# Altium integrated library Cap-Cer-SMD_V2.IntLib: 957 symbols (part 2 of 7)
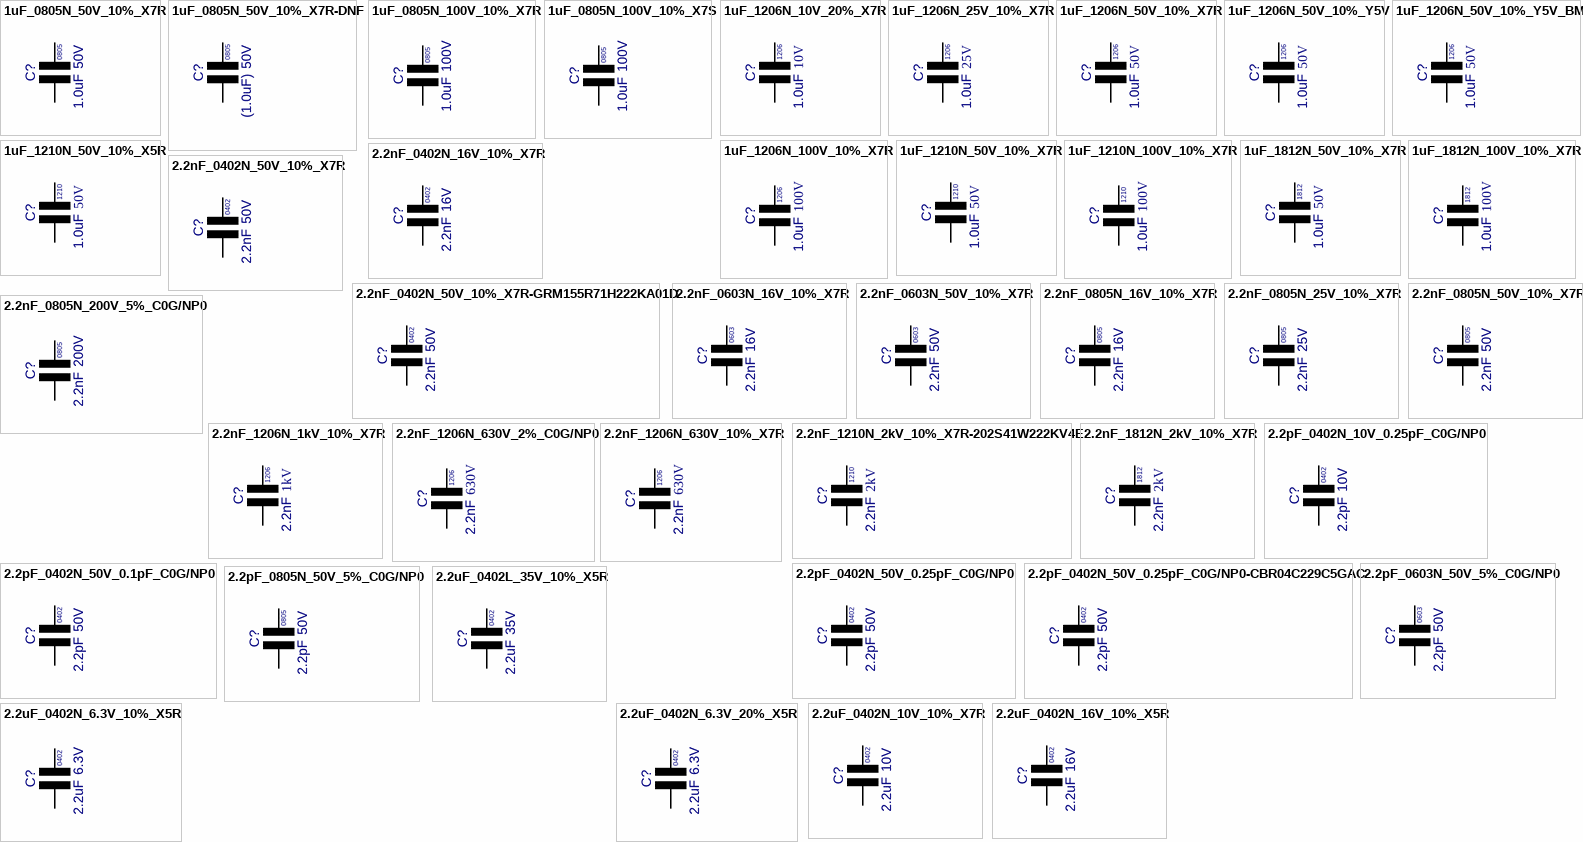
[diagram p24: symbols 1uF_0805N_50V_10%_X7R to 2.2uF_0402N_16V_10%_X5R]

## 2.2nF_1210N_2kV_10%_X7R-202S41W222KV4E
designator C?, comment value 2.2nF  Voltage: 2kV  Text1: 1210  (hidden comment: 2.2nF_C1210_2kV_10%_X7R)
Cap Ceramic X7R; Manufacturer: Johanson; Part Number: 202S41W222KV4E; Tol: 10%; Package: CAPC1210X180N; EDM-PN: *; Text2: *; SAAB PN: *; DCE Part No: *
footprint CAPC1210X180N (Chip Capacitor, 1210, 2-Leads, Body 3.2x2.5mm, IPC Medium Density)
pins: 1, 2

## 2.2nF_1812N_2kV_10%_X7R
designator C?, comment value 2.2nF  Voltage: 2kV  Text1: 1812  (hidden comment: 2.2nF_C1812_2kV_10%_X7R)
Cap Ceramic X7R; Manufacturer: Various; Part Number: 2.2nF 1812 2kV 10% X7R; Tol: 10%; Package: CAPC1812X135N; EDM-PN: *; Text2: *; SAAB PN: *; DCE Part No: *
footprint CAPC1812X135N (Chip Capacitor, 1812, 2-Leads, Body 4.5x3.2mm, IPC Medium Density)
pins: 1, 2

## 2.2pF_0402N_10V_0.25pF_C0G/NP0
designator C?, comment value 2.2pF  Voltage: 10V  Text1: 0402  (hidden comment: 2.2pF_C0402_10V_0.25_C0G/NP0)
Cap Ceramic C0G/NP0; Manufacturer: Various; Part Number: 2.2pF 0402 10V 0.25 C0G/NP0; Tol: 0.25pF; Package: CAPC0402X60N; EDM-PN: *; Text2: *; SAAB PN: *; DCE Part No: *
footprint CAPC0402X60N (Chip Capacitor, 0402, 2-Leads, Body 1.0x0.5mm, IPC Medium Density)
pins: 1, 2

## 2.2pF_0402N_50V_0.1pF_C0G/NP0
designator C?, comment value 2.2pF  Voltage: 50V  Text1: 0402  (hidden comment: 2.2pF_C0402_50V_0.1pF_C0G/NP0)
Cap Ceramic C0G/NP0; Manufacturer: Various; Part Number: 2.2pF 0402 50V 0.1pF C0G/NP0; EDM-PN: CAP1388; Tol: 0.1pF; Package: CAPC0402X60N; Text2: *; SAAB PN: *; DCE Part No: *
footprint CAPC0402X60N (Chip Capacitor, 0402, 2-Leads, Body 1.0x0.5mm, IPC Medium Density)
pins: 1, 2

## 2.2pF_0402N_50V_0.25pF_C0G/NP0
designator C?, comment value 2.2pF  Voltage: 50V  Text1: 0402  (hidden comment: 2.2pF_C0402_50V_0.25pF_C0G/NP0)
Cap Ceramic C0G/NP0; Manufacturer: Various; Part Number: 2.2pF 0402 50V 0.25pF C0G/NP0; EDM-PN: CAP603; Tol: 0.25pF; Package: CAPC0402X60N; Text2: *; SAAB PN: *; DCE Part No: *
footprint CAPC0402X60N (Chip Capacitor, 0402, 2-Leads, Body 1.0x0.5mm, IPC Medium Density)
pins: 1, 2

## 2.2pF_0402N_50V_0.25pF_C0G/NP0-CBR04C229C5GAC
designator C?, comment value 2.2pF  Voltage: 50V  Text1: 0402  (hidden comment: CBR04C229C5GAC)
Cap Ceramic C0G/NP0 HiQ-CBR Series for RF; Manufacturer: Kemet; EDM-PN: CAP1404; Tol: 0.25pF; Part Number: CBR04C229C5GAC; Package: CAPC0402X60N; Text2: *; SAAB PN: *; DCE Part No: *
footprint CAPC0402X60N (Chip Capacitor, 0402, 2-Leads, Body 1.0x0.5mm, IPC Medium Density)
pins: 1, 2

## 2.2pF_0603N_50V_5%_C0G/NP0
designator C?, comment value 2.2pF  Voltage: 50V  Text1: 0603  (hidden comment: 2.2pF_C0603_50V_5%_C0G/NP0)
Cap Ceramic C0G/NP0; Manufacturer: Various; Part Number: 2.2pF 0603 50V 5% C0G/NP0; Tol: 5%; Package: CAPC0603X85N; EDM-PN: *; Text2: *; SAAB PN: *; DCE Part No: *
footprint CAPC0603X85N (Chip Capacitor, 0603, 2-Leads, Body 1.6x0.8mm, IPC Medium Density)
pins: 1, 2

## 2.2pF_0805N_50V_5%_C0G/NP0
designator C?, comment value 2.2pF  Voltage: 50V  Text1: 0805  (hidden comment: 2.2pF_C0805_50V_5%_C0G/NP0)
Cap Ceramic C0G/NP0; Manufacturer: Various; Part Number: 2.2pF 0805 50V 5% C0G/NP0; Tol: 5%; Package: CAPC0805X110N; EDM-PN: *; Text2: *; SAAB PN: *; DCE Part No: *
footprint CAPC0805X110N (Chip Capacitor, 0805, 2-Leads, Body 2.0x1.3mm, IPC Medium Density)
pins: 1, 2

## 2.2uF_0402L_35V_10%_X5R
designator C?, comment value 2.2uF  Voltage: 35V  Text1: 0402  (hidden comment: 2.2uF_C0402_35V_10%_X5R)
Cap Ceramic X5R; Manufacturer: Various; Part Number: 2.2uF 0402 35V 10% X5R; Tol: 10%; Package: CAPC0402X60L; EDM-PN: *; Text2: *; SAAB PN: *; DCE Part No: *
footprint CAPC0402X60L (Chip Capacitor, 0402, 2-Leads, Body 1.0x0.5mm, IPC High Density)
pins: 1, 2

## 2.2uF_0402N_6.3V_10%_X5R
designator C?, comment value 2.2uF  Voltage: 6.3V  Text1: 0402  (hidden comment: 2.2uF_C0402_6.3_10%_X5R)
Cap Ceramic X5R; Manufacturer: Various; Part Number: 2.2uF 0402 6.3V 10% X5R; Tol: 10%; Package: CAPC0402X60N; EDM-PN: *; Text2: *; SAAB PN: *; DCE Part No: *
footprint CAPC0402X60N (Chip Capacitor, 0402, 2-Leads, Body 1.0x0.5mm, IPC Medium Density)
pins: 1, 2

## 2.2uF_0402N_6.3V_20%_X5R
designator C?, comment value 2.2uF  Voltage: 6.3V  Text1: 0402  (hidden comment: 2.2uF_C0402_6.3V_20%_X5R)
Cap Ceramic X5R; Manufacturer: Various; Part Number: 2.2uF 0402 6.3V 20% X5R; DCE Part No: 9725; EDM-PN: CAP323; Tol: 20%; Package: CAPC0402X60N; Text2: *; SAAB PN: *
footprint CAPC0402X60N (Chip Capacitor, 0402, 2-Leads, Body 1.0x0.5mm, IPC Medium Density)
pins: 1, 2

## 2.2uF_0402N_10V_10%_X7R
designator C?, comment value 2.2uF  Voltage: 10V  Text1: 0402  (hidden comment: 2.2uF_C0402_10V_10%_X7R)
Cap Ceramic X7R; Manufacturer: Various; Part Number: 2.2uF 0402 10V 10% X7R; Tol: 10%; Package: CAPC0402X60N; EDM-PN: *; Text2: *; SAAB PN: *; DCE Part No: *
footprint CAPC0402X60N (Chip Capacitor, 0402, 2-Leads, Body 1.0x0.5mm, IPC Medium Density)
pins: 1, 2

## 2.2uF_0402N_16V_10%_X5R
designator C?, comment value 2.2uF  Voltage: 16V  Text1: 0402  (hidden comment: 2.2uF_C0402_16V_10%_X5R)
Cap Ceramic X5R; Manufacturer: Various; Part Number: 2.2uF 0402 16V 10% X5R; EDM-PN: CAP1331; Tol: 10%; Package: CAPC0402X60N; Text2: *; SAAB PN: *; DCE Part No: *
footprint CAPC0402X60N (Chip Capacitor, 0402, 2-Leads, Body 1.0x0.5mm, IPC Medium Density)
pins: 1, 2

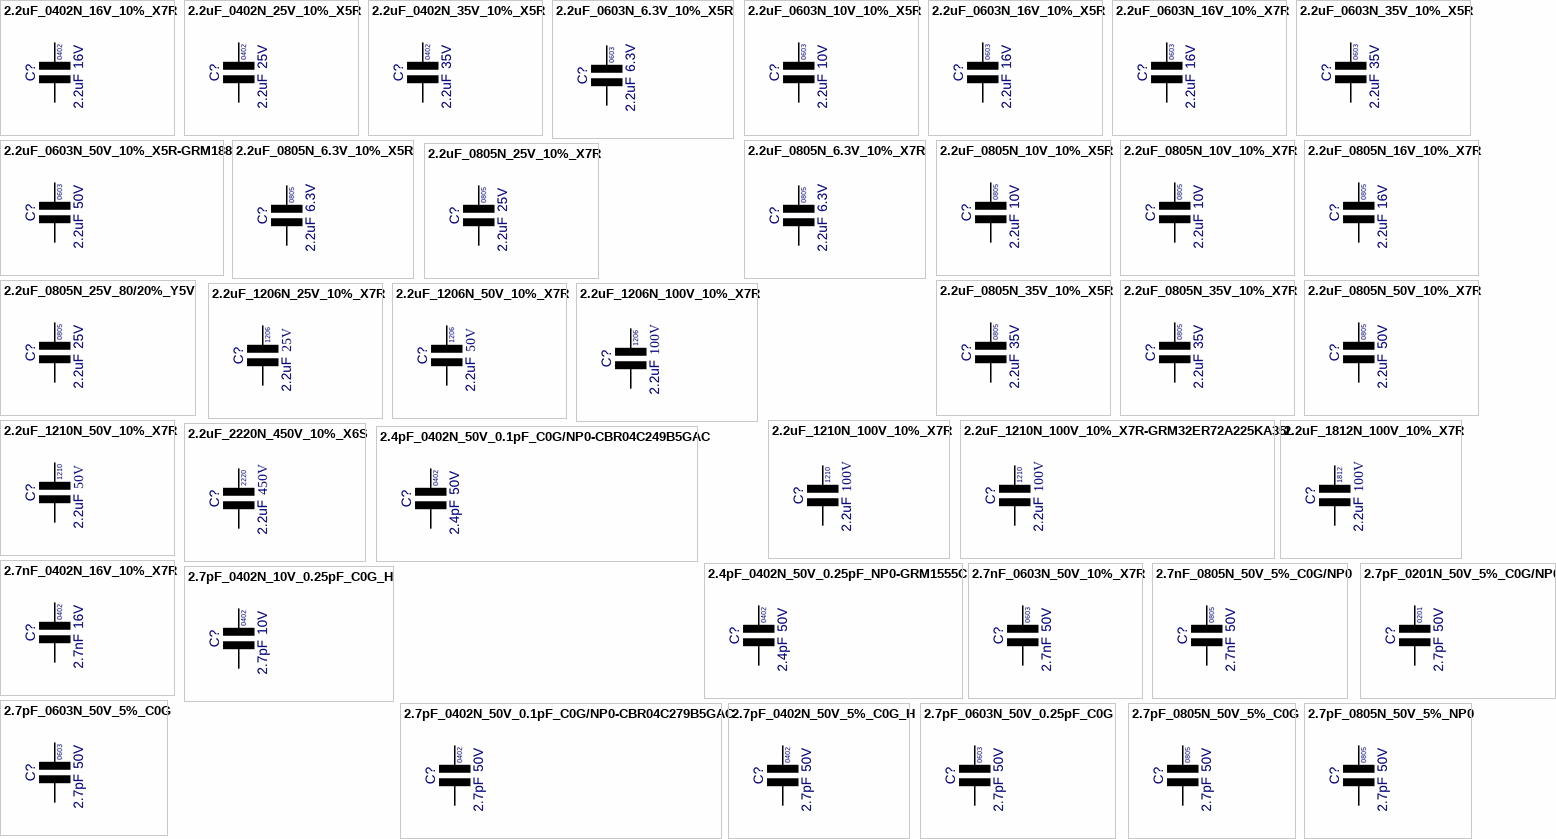
[diagram p4: symbols 2.2uF_0402N_16V_10%_X7R to 2.7pF_0805N_50V_5%_NP0]

## 2.2uF_0402N_16V_10%_X7R
designator C?, comment value 2.2uF  Voltage: 16V  Text1: 0402  (hidden comment: 2.2uF_C0402_16V_10%_X7R)
Cap Ceramic X7R; Manufacturer: Various; Part Number: 2.2uF 0402 16V 10% X7R; EDM-PN: CAP1033; Tol: 10%; Package: CAPC0402X60N; Text2: *; SAAB PN: *; DCE Part No: *
footprint CAPC0402X60N (Chip Capacitor, 0402, 2-Leads, Body 1.0x0.5mm, IPC Medium Density)
pins: 1, 2

## 2.2uF_0402N_25V_10%_X5R
designator C?, comment value 2.2uF  Voltage: 25V  Text1: 0402  (hidden comment: 2.2uF_C0402_25V_10%_X5R)
Cap Ceramic X5R; Manufacturer: Various; Part Number: 2.2uF 0402 25V 10% X5R; Tol: 10%; Package: CAPC0402X60N; EDM-PN: *; Text2: *; SAAB PN: *; DCE Part No: *
footprint CAPC0402X60N (Chip Capacitor, 0402, 2-Leads, Body 1.0x0.5mm, IPC Medium Density)
pins: 1, 2

## 2.2uF_0402N_35V_10%_X5R
designator C?, comment value 2.2uF  Voltage: 35V  Text1: 0402  (hidden comment: 2.2uF_C0402_35V_10%_X5R)
Cap Ceramic X5R; Manufacturer: Various; Part Number: 2.2uF 0402 35V 10% X5R; Tol: 10%; Package: CAPC0402X60N; EDM-PN: *; Text2: *; SAAB PN: *; DCE Part No: *
footprint CAPC0402X60N (Chip Capacitor, 0402, 2-Leads, Body 1.0x0.5mm, IPC Medium Density)
pins: 1, 2

## 2.2uF_0603N_6.3V_10%_X5R
designator C?, comment value 2.2uF  Voltage: 6.3V  Text1: 0603  (hidden comment: 2.2uF_C0603_6.3V_10%_X5R)
Cap Ceramic X5R; Manufacturer: Various; Part Number: 2.2uF 0603 6.3V 10% X5R; Tol: 10%; Package: CAPC0603X85N; EDM-PN: *; Text2: *; SAAB PN: *; DCE Part No: *
footprint CAPC0603X85N (Chip Capacitor, 0603, 2-Leads, Body 1.6x0.8mm, IPC Medium Density)
pins: 1, 2

## 2.2uF_0603N_10V_10%_X5R
designator C?, comment value 2.2uF  Voltage: 10V  Text1: 0603  (hidden comment: 2.2uF_C0603_10V_10%_X5R)
Cap Ceramic X5R; Manufacturer: Various; Part Number: 2.2uF 0603 10V 10% X5R; EDM-PN: CAP600; Tol: 10%; Package: CAPC0603X85N; Text2: *; SAAB PN: *; DCE Part No: *
footprint CAPC0603X85N (Chip Capacitor, 0603, 2-Leads, Body 1.6x0.8mm, IPC Medium Density)
pins: 1, 2

## 2.2uF_0603N_16V_10%_X5R
designator C?, comment value 2.2uF  Voltage: 16V  Text1: 0603  (hidden comment: 2.2uF_C0603_16V_10%_X5R)
Cap Ceramic X5R; Manufacturer: Various; Part Number: 2.2uF 0603 16V 10% X5R; EDM-PN: CAP616; Tol: 10%; Package: CAPC0603X85N; Text2: *; SAAB PN: *; DCE Part No: *
footprint CAPC0603X85N (Chip Capacitor, 0603, 2-Leads, Body 1.6x0.8mm, IPC Medium Density)
pins: 1, 2

## 2.2uF_0603N_16V_10%_X7R
designator C?, comment value 2.2uF  Voltage: 16V  Text1: 0603  (hidden comment: 2.2uF_C0603_16V_10%_X7R)
Cap Ceramic X7R; Manufacturer: Various; Part Number: 2.2uF 0603 16V 10% X7R; EDM-PN: CAP616; Tol: 10%; Reutech PN: 5910-CA-0549; Package: CAPC0603X85N; Text2: *; SAAB PN: *; DCE Part No: *
footprint CAPC0603X85N (Chip Capacitor, 0603, 2-Leads, Body 1.6x0.8mm, IPC Medium Density)
pins: 1, 2

## 2.2uF_0603N_35V_10%_X5R
designator C?, comment value 2.2uF  Voltage: 35V  Text1: 0603  (hidden comment: 2.2uF_C0603_35V_10%_X5R)
Cap Ceramic X5R; Manufacturer: Various; Part Number: 2.2uF 0603 35V 10% X5R; EDM-PN: CAP940; Tol: 10%; Package: CAPC0603X85N; Text2: *; SAAB PN: *; DCE Part No: *
footprint CAPC0603X85N (Chip Capacitor, 0603, 2-Leads, Body 1.6x0.8mm, IPC Medium Density)
pins: 1, 2

## 2.2uF_0603N_50V_10%_X5R-GRM188
designator C?, comment value 2.2uF  Voltage: 50V  Text1: 0603  (hidden comment: 2.2uF_C0603_50V_10%_X5R)
Cap Ceramic X5R; Manufacturer: Murata; Part Number: GRM188R61H225KE11D; Tol: 10%; Package: CAPC0603X85N; EDM-PN: *; Text2: *; SAAB PN: *; DCE Part No: *
footprint CAPC0603X85N (Chip Capacitor, 0603, 2-Leads, Body 1.6x0.8mm, IPC Medium Density)
pins: 1, 2

## 2.2uF_0805N_6.3V_10%_X5R
designator C?, comment value 2.2uF  Voltage: 6.3V  Text1: 0805  (hidden comment: 2.2uF_C0805_6.3V_10%_X5R)
Cap Ceramic X5R; Manufacturer: Various; Part Number: 2.2uF 0805 6.3V 10% X5R; Tol: 10%; Package: CAPC0805X110N; EDM-PN: *; Text2: *; SAAB PN: *; DCE Part No: *
footprint CAPC0805X110N (Chip Capacitor, 0805, 2-Leads, Body 2.0x1.3mm, IPC Medium Density)
pins: 1, 2

## 2.2uF_0805N_6.3V_10%_X7R
designator C?, comment value 2.2uF  Voltage: 6.3V  Text1: 0805  (hidden comment: 2.2uF_C0805_6.3V_10%_X7R)
Cap Ceramic X7R; Manufacturer: Various; Part Number: 2.2uF 0805 6.3V 10% X7R; Tol: 10%; Package: CAPC0805X110N; EDM-PN: *; Text2: *; SAAB PN: *; DCE Part No: *
footprint CAPC0805X110N (Chip Capacitor, 0805, 2-Leads, Body 2.0x1.3mm, IPC Medium Density)
pins: 1, 2

## 2.2uF_0805N_10V_10%_X5R
designator C?, comment value 2.2uF  Voltage: 10V  Text1: 0805  (hidden comment: 2.2uF_C0805_10V_10%_X5R)
Cap Ceramic X5R; Manufacturer: Various; Part Number: 2.2uF 0805 10V 10% X5R; Tol: 10%; Package: CAPC0805X110N; EDM-PN: *; Text2: *; SAAB PN: *; DCE Part No: *
footprint CAPC0805X110N (Chip Capacitor, 0805, 2-Leads, Body 2.0x1.3mm, IPC Medium Density)
pins: 1, 2

## 2.2uF_0805N_10V_10%_X7R
designator C?, comment value 2.2uF  Voltage: 10V  Text1: 0805  (hidden comment: 2.2uF_C0805_10V_10%_X7R)
Cap Ceramic X7R; Manufacturer: Various; Part Number: 2.2uF 0805 10V 10% X7R; Tol: 10%; Package: CAPC0805X110N; EDM-PN: *; Text2: *; SAAB PN: *; DCE Part No: *
footprint CAPC0805X110N (Chip Capacitor, 0805, 2-Leads, Body 2.0x1.3mm, IPC Medium Density)
pins: 1, 2

## 2.2uF_0805N_16V_10%_X7R
designator C?, comment value 2.2uF  Voltage: 16V  Text1: 0805  (hidden comment: 2.2uF_C0805_16V_10%_X7R)
Cap Ceramic X7R; Manufacturer: Various; Part Number: 2.2uF 0805 16V 10% X7R; Tol: 10%; Reutech PN: 5910-CA-0475; Package: CAPC0805X110N; EDM-PN: *; Text2: *; SAAB PN: *; DCE Part No: *
footprint CAPC0805X110N (Chip Capacitor, 0805, 2-Leads, Body 2.0x1.3mm, IPC Medium Density)
pins: 1, 2

## 2.2uF_0805N_25V_10%_X7R
designator C?, comment value 2.2uF  Voltage: 25V  Text1: 0805  (hidden comment: 2.2uF_C0805_25V_10%_X7R)
Cap Ceramic X7R; Manufacturer: Various; Part Number: 2.2uF 0805 25V 10% X7R; Tol: 10%; Package: CAPC0805X135N; EDM-PN: *; Text2: *; SAAB PN: *; DCE Part No: *
footprint CAPC0805X135N (Chip Capacitor, 0805, 2-Leads, Body 2.0x1.3mm, IPC Medium Density)
pins: 1, 2

## 2.2uF_0805N_25V_80/20%_Y5V
designator C?, comment value 2.2uF  Voltage: 25V  Text1: 0805  (hidden comment: 2.2uF_C0805_25V_80/20%_T5V)
Cap Ceramic Y5V; Manufacturer: Various; Part Number: 2.2uF 0805 25V 80/20% Y5V; Tol: 80/20%; Package: CAPC0805X135N; EDM-PN: *; Text2: *; SAAB PN: *; DCE Part No: *
footprint CAPC0805X135N (Chip Capacitor, 0805, 2-Leads, Body 2.0x1.3mm, IPC Medium Density)
pins: 1, 2

## 2.2uF_0805N_35V_10%_X5R
designator C?, comment value 2.2uF  Voltage: 35V  Text1: 0805  (hidden comment: 2.2uF_C0805_35V_10%_X5R)
Cap Ceramic X5R; Manufacturer: Various; Part Number: 2.2uF 0805 35V 10% X5R; Tol: 10%; Package: CAPC0805X135N; EDM-PN: *; Text2: *; SAAB PN: *; DCE Part No: *
footprint CAPC0805X135N (Chip Capacitor, 0805, 2-Leads, Body 2.0x1.3mm, IPC Medium Density)
pins: 1, 2

## 2.2uF_0805N_35V_10%_X7R
designator C?, comment value 2.2uF  Voltage: 35V  Text1: 0805  (hidden comment: 2.2uF_C0805_35V_10%_X7R)
Cap Ceramic X7R; Manufacturer: Various; Part Number: 2.2uF 0805 35V 10% X7R; Tol: 10%; Package: CAPC0805X135N; EDM-PN: *; Text2: *; SAAB PN: *; DCE Part No: *
footprint CAPC0805X135N (Chip Capacitor, 0805, 2-Leads, Body 2.0x1.3mm, IPC Medium Density)
pins: 1, 2

## 2.2uF_0805N_50V_10%_X7R
designator C?, comment value 2.2uF  Voltage: 50V  Text1: 0805  (hidden comment: 2.2uF_C0805_50V_10%_X7R)
Cap Ceramic X7R; Manufacturer: Various; Part Number: 2.2uF 0805 50V 10% X7R; Tol: 10%; Package: CAPC0805X135N; EDM-PN: *; Text2: *; SAAB PN: *; DCE Part No: *
footprint CAPC0805X135N (Chip Capacitor, 0805, 2-Leads, Body 2.0x1.3mm, IPC Medium Density)
pins: 1, 2

## 2.2uF_1206N_25V_10%_X7R
designator C?, comment value 2.2uF  Voltage: 25V  Text1: 1206  (hidden comment: 2.2uF_C1206_25V_10%_X7R)
Cap Ceramic X7R; Manufacturer: Various; Part Number: 2.2uF 1206 25V 10% X7R; Tol: 10%; Package: CAPC1206X135N; EDM-PN: *; Text2: *; SAAB PN: *; DCE Part No: *
footprint CAPC1206X135N (Chip Capacitor, 1206, 2-Leads, Body 3.2x1.6mm, IPC Medium Density)
pins: 1, 2

## 2.2uF_1206N_50V_10%_X7R
designator C?, comment value 2.2uF  Voltage: 50V  Text1: 1206  (hidden comment: 2.2uF_C1206_50V_10%_X7R)
Cap Ceramic X7R; Manufacturer: Various; Part Number: 2.2uF 1206 50V 10% X7R; Tol: 10%; Package: CAPC1206X135N; EDM-PN: *; Text2: *; SAAB PN: *; DCE Part No: *
footprint CAPC1206X135N (Chip Capacitor, 1206, 2-Leads, Body 3.2x1.6mm, IPC Medium Density)
pins: 1, 2

## 2.2uF_1206N_100V_10%_X7R
designator C?, comment value 2.2uF  Voltage: 100V  Text1: 1206  (hidden comment: 2.2uF_C1206_100V_10%_X7R)
Cap Ceramic X7R; Manufacturer: Various; Part Number: 2.2uF 1206 100V 10% X7R; Tol: 10%; Package: CAPC1206X135N; EDM-PN: *; Text2: *; SAAB PN: *; DCE Part No: *
footprint CAPC1206X178N (Chip Capacitor, 1206, 2-Leads, Body 3.2x1.6mm, IPC Medium Density)
pins: 1, 2

## 2.2uF_1210N_50V_10%_X7R
designator C?, comment value 2.2uF  Voltage: 50V  Text1: 1210  (hidden comment: 2.2uF_C1210_50V_10%_X7R)
Cap Ceramic X7R; Manufacturer: Various; Part Number: 2.2uF 1210 50V 10% X7R; Tol: 10%; Package: CAPC1210X135N; EDM-PN: *; Text2: *; SAAB PN: *; DCE Part No: *
footprint CAPC1210X135N (Chip Capacitor, 1210, 2-Leads, Body 3.2x2.5mm, IPC Medium Density)
pins: 1, 2

## 2.2uF_1210N_100V_10%_X7R
designator C?, comment value 2.2uF  Voltage: 100V  Text1: 1210  (hidden comment: 2.2uF_C1210_100V_10%_X7R)
Cap Ceramic X7R; Manufacturer: Various; Part Number: 2.2uF 1210 100V 10% X7R; EDM-PN: CAP694; Tol: 10%; Reutech PN: 5910-CA-0484; SAAB PN: 1AAB00454AEA; Package: CAPC1210X135N; Text2: *; DCE Part No: *
footprint CAPC1210X135N (Chip Capacitor, 1210, 2-Leads, Body 3.2x2.5mm, IPC Medium Density)
pins: 1, 2

## 2.2uF_1210N_100V_10%_X7R-GRM32ER72A225KA35L
designator C?, comment value 2.2uF  Voltage: 100V  Text1: 1210  (hidden comment: GRM32ER72A225KA35L)
Cap Ceramic X7R; Manufacturer: Murata; Tol: 10%; Reutech PN: 5910-CA-0484; SAAB PN: 1AAB00454AEA; Part Number: GRM32ER72A225KA35L; Package: CAPC1210X135N; EDM-PN: *; Text2: *; DCE Part No: *
footprint CAPC1210X135N (Chip Capacitor, 1210, 2-Leads, Body 3.2x2.5mm, IPC Medium Density)
pins: 1, 2

## 2.2uF_1812N_100V_10%_X7R
designator C?, comment value 2.2uF  Voltage: 100V  Text1: 1812  (hidden comment: 2.2uF_C1812_100V_10%_X7R)
Cap Ceramic X7R; Manufacturer: Various; Part Number: 2.2uF 1812 100V 10% X7R; Tol: 10%; Package: CAPC1812X135N; EDM-PN: *; Text2: *; SAAB PN: *; DCE Part No: *
footprint CAPC1812X135N (Chip Capacitor, 1812, 2-Leads, Body 4.5x3.2mm, IPC Medium Density)
pins: 1, 2

## 2.2uF_2220N_450V_10%_X6S
designator C?, comment value 2.2uF  Voltage: 450V  Text1: 2220  (hidden comment: 2.2uF_C2220_450V_10%_X6S)
Cap Ceramic X6S; Manufacturer: Various; Part Number: 2.2uF 2220 450V 10% X6S; Tol: 10%; Package: CAPC1812X135N; EDM-PN: *; Text2: *; SAAB PN: *; DCE Part No: *
footprint CAPC2220x280 (Chip Capacitor, 2220, 2-Leads, Body 5.6x5.0mm)
pins: 1, 2

## 2.4pF_0402N_50V_0.1pF_C0G/NP0-CBR04C249B5GAC
designator C?, comment value 2.4pF  Voltage: 50V  Text1: 0402  (hidden comment: CBR04C249B5GAC)
Cap Ceramic C0G/NP0 HiQ-CBR Series for RF; Manufacturer: Kemet; Part Number: CBR04C569B5GAC; EDM-PN: CAP1407; Tol: 0.1pF; Package: CAPC0402X60N; Text2: *; SAAB PN: *; DCE Part No: *
footprint CAPC0402X60N (Chip Capacitor, 0402, 2-Leads, Body 1.0x0.5mm, IPC Medium Density)
pins: 1, 2

## 2.4pF_0402N_50V_0.25pF_NP0-GRM1555C
designator C?, comment value 2.4pF  Voltage: 50V  Text1: 0402  (hidden comment: 2.4pF_C0402_50V_0.25pF_NP0)
Cap Ceramic NP0; Manufacturer: Murata; Part Number: GRM1555C1H2R4CZ01D; EDM-PN: CAP875; Tol: 0.25pF; Package: GRM155-0.20; Text2: *; SAAB PN: *; DCE Part No: *
footprint GRM155-0.20 (GRM155 0402 1.0x0.5mm)
pins: 1, 2

## 2.7nF_0402N_16V_10%_X7R
designator C?, comment value 2.7nF  Voltage: 16V  Text1: 0402  (hidden comment: 2.7nF_C0402_16V_10%_X7R)
Cap Ceramic X7R; Manufacturer: Various; Part Number: 2.7nF 0402 16V 10% X7R; EDM-PN: CAP1389; Tol: 10%; Package: CAPC0402X60N; Text2: *; SAAB PN: *; DCE Part No: *
footprint CAPC0402X60N (Chip Capacitor, 0402, 2-Leads, Body 1.0x0.5mm, IPC Medium Density)
pins: 1, 2

## 2.7nF_0603N_50V_10%_X7R
designator C?, comment value 2.7nF  Voltage: 50V  Text1: 0603  (hidden comment: 2.7nF_C0603_50V_10%_X7R)
Cap Ceramic X7R; Manufacturer: Various; Part Number: 2.7nF 0603 50V 10% X7R; EDM-PN: CAP861; Tol: 10%; Package: CAPC0603X85N; Text2: *; SAAB PN: *; DCE Part No: *
footprint CAPC0603X85N (Chip Capacitor, 0603, 2-Leads, Body 1.6x0.8mm, IPC Medium Density)
pins: 1, 2

## 2.7nF_0805N_50V_5%_C0G/NP0
designator C?, comment value 2.7nF  Voltage: 50V  Text1: 0805  (hidden comment: 2.7nF_C0805_50V_5%_C0G/NP0)
Cap Ceramic C0G/NP0; Manufacturer: Various; Part Number: 2.7nF 0805 50V 5% C0G/NP0; Tol: 5%; Package: CAPC0805X110N; EDM-PN: *; Text2: *; SAAB PN: *; DCE Part No: *
footprint CAPC0805X110N (Chip Capacitor, 0805, 2-Leads, Body 2.0x1.3mm, IPC Medium Density)
pins: 1, 2

## 2.7pF_0201N_50V_5%_C0G/NP0
designator C?, comment value 2.7pF  Voltage: 50V  Text1: 0201  (hidden comment: 2.7pF_C0201_50V_5%_C0G/NP0)
Cap Ceramic C0G/NP0; Manufacturer: Various; Part Number: 2.7pF 0201 50V 5%_C0G/NP0; Tol: 5%; Package: CAPC0201X33N; EDM-PN: *; Text2: *; SAAB PN: *; DCE Part No: *
footprint CAPC0201X33N (Chip Capacitor, 0201, 2-Leads, Body 0.6x0.3mm, IPC Medium Density)
pins: 1, 2

## 2.7pF_0402N_10V_0.25pF_C0G_H
designator C?, comment value 2.7pF  Voltage: 10V  Text1: 0402  (hidden comment: 2.7pF_C0402_10V_0.25_C0G)
Cap Ceramic C0G; Manufacturer: Various; Part Number: 2.7pF 0402 10V 0.25 C0G; Tol: 0.25pF; Package: CAPC0402X60N; EDM-PN: *; Text2: *; SAAB PN: *; DCE Part No: *
footprint CAPC0402X60N (Chip Capacitor, 0402, 2-Leads, Body 1.0x0.5mm, IPC Medium Density)
pins: 1, 2

## 2.7pF_0402N_50V_0.1pF_C0G/NP0-CBR04C279B5GAC
designator C?, comment value 2.7pF  Voltage: 50V  Text1: 0402  (hidden comment: CBR04C279B5GAC)
Cap Ceramic C0G/NP0 HiQ-CBR Series for RF; Manufacturer: Kemet; EDM-PN: CAP1401; Tol: 0.1pF; Part Number: CBR04C279B5GAC; Package: CAPC0402X60N; Text2: *; SAAB PN: *; DCE Part No: *
footprint CAPC0402X60N (Chip Capacitor, 0402, 2-Leads, Body 1.0x0.5mm, IPC Medium Density)
pins: 1, 2

## 2.7pF_0402N_50V_5%_C0G_H
designator C?, comment value 2.7pF  Voltage: 50V  Text1: 0402  (hidden comment: 2.7pF_C0402_50V_5%_C0G)
Cap Ceramic C0G; Manufacturer: Various; Part Number: 2.7pF 0402 50V 5% C0G; EDM-PN: CAP932; Tol: 5%; Package: CAPC0402X60N; Text2: *; SAAB PN: *; DCE Part No: *
footprint CAPC0402X60N (Chip Capacitor, 0402, 2-Leads, Body 1.0x0.5mm, IPC Medium Density)
pins: 1, 2

## 2.7pF_0603N_50V_0.25pF_C0G
designator C?, comment value 2.7pF  Voltage: 50V  Text1: 0603  (hidden comment: 2.7pF_C0603_50V_0.25pF_C0G)
Cap Ceramic C0G; Manufacturer: Various; Part Number: 2.7pF 0603 50V 0.25pF C0G; Tol: 0.25pF; Package: CAPC0603X85N; EDM-PN: *; Text2: *; SAAB PN: *; DCE Part No: *
footprint CAPC0603X85N (Chip Capacitor, 0603, 2-Leads, Body 1.6x0.8mm, IPC Medium Density)
pins: 1, 2

## 2.7pF_0603N_50V_5%_C0G
designator C?, comment value 2.7pF  Voltage: 50V  Text1: 0603  (hidden comment: 2.7pF_C0603_50V_5%_C0G)
Cap Ceramic C0G; Manufacturer: Various; Part Number: 2.7pF 0603 50V 5% C0G; Tol: 5%; Package: CAPC0603X85N; EDM-PN: *; Text2: *; SAAB PN: *; DCE Part No: *
footprint CAPC0603X85N (Chip Capacitor, 0603, 2-Leads, Body 1.6x0.8mm, IPC Medium Density)
pins: 1, 2

## 2.7pF_0805N_50V_5%_C0G
designator C?, comment value 2.7pF  Voltage: 50V  Text1: 0805  (hidden comment: 2.7pF_C0805_50V_5%_C0G)
Cap Ceramic C0G; Manufacturer: Various; Part Number: 2.7pF 0805 50V 5% C0G; Tol: 5%; Package: CAPC0805X110N; EDM-PN: *; Text2: *; SAAB PN: *; DCE Part No: *
footprint CAPC0805X110N (Chip Capacitor, 0805, 2-Leads, Body 2.0x1.3mm, IPC Medium Density)
pins: 1, 2

## 2.7pF_0805N_50V_5%_NP0
designator C?, comment value 2.7pF  Voltage: 50V  Text1: 0805  (hidden comment: 2.7pF_C0805_50V_5%_NP0)
Cap Ceramic NP0; Manufacturer: Various; Part Number: 2.7pF 0805 50V 5% C0G/NP0; Tol: 5%; Package: CAPC0805X110N; EDM-PN: *; Text2: *; SAAB PN: *; DCE Part No: *
footprint CAPC0805X110N (Chip Capacitor, 0805, 2-Leads, Body 2.0x1.3mm, IPC Medium Density)
pins: 1, 2

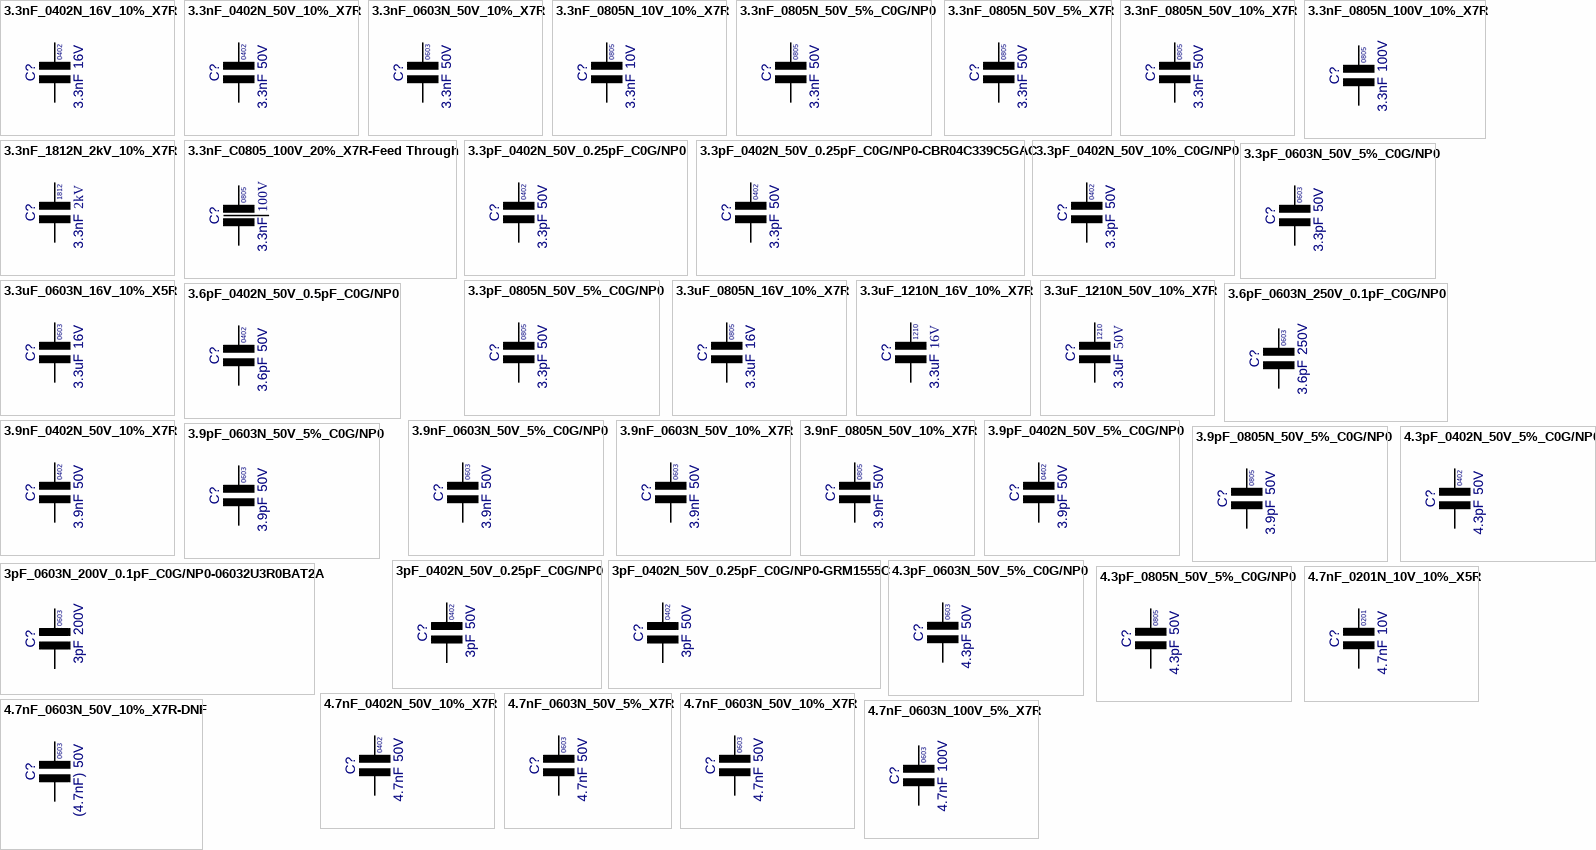
[diagram p5: symbols 3.3nF_0402N_16V_10%_X7R to 4.7nF_0603N_100V_5%_X7R]

## 3.3nF_0402N_16V_10%_X7R
designator C?, comment value 3.3nF  Voltage: 16V  Text1: 0402  (hidden comment: 3.3nF_C0402_16V_10%_X7R)
Cap Ceramic X7R; Manufacturer: Various; Part Number: 3.3nF 0402 16V 10% X7R; DCE Part No: 8051; Tol: 10%; Package: CAPC0402X60N; EDM-PN: *; Text2: *; SAAB PN: *
footprint CAPC0402X60N (Chip Capacitor, 0402, 2-Leads, Body 1.0x0.5mm, IPC Medium Density)
pins: 1, 2

## 3.3nF_0402N_50V_10%_X7R
designator C?, comment value 3.3nF  Voltage: 50V  Text1: 0402  (hidden comment: 3.3nF_C0402_50V_10%_X7R)
Cap Ceramic X7R; Manufacturer: Various; Part Number: 3.3nF 0402 50V 10% X7R; EDM-PN: CAP1038; Tol: 10%; Package: CAPC0402X60N; Text2: *; SAAB PN: *; DCE Part No: *
footprint CAPC0402X60N (Chip Capacitor, 0402, 2-Leads, Body 1.0x0.5mm, IPC Medium Density)
pins: 1, 2

## 3.3nF_0603N_50V_10%_X7R
designator C?, comment value 3.3nF  Voltage: 50V  Text1: 0603  (hidden comment: 3.3nF_C0603_50V_10%_X7R)
Cap Ceramic X7R; Manufacturer: Various; Part Number: 3.3nF 0603 50V 10% X7R; Tol: 10%; Package: CAPC0603X85N; EDM-PN: *; Text2: *; SAAB PN: *; DCE Part No: *
footprint CAPC0603X85N (Chip Capacitor, 0603, 2-Leads, Body 1.6x0.8mm, IPC Medium Density)
pins: 1, 2

## 3.3nF_0805N_10V_10%_X7R
designator C?, comment value 3.3nF  Voltage: 10V  Text1: 0805  (hidden comment: 3.3nF_C0805_10V_10%_X7R)
Cap Ceramic X7R; Manufacturer: Various; Part Number: 3.3nF 0805 10V 10% X7R; Tol: 10%; Package: CAPC0805X110N; EDM-PN: *; Text2: *; SAAB PN: *; DCE Part No: *
footprint CAPC0805X110N (Chip Capacitor, 0805, 2-Leads, Body 2.0x1.3mm, IPC Medium Density)
pins: 1, 2

## 3.3nF_0805N_50V_5%_C0G/NP0
designator C?, comment value 3.3nF  Voltage: 50V  Text1: 0805  (hidden comment: 3.3nF_C0805_50V_5%_C0G/NP0)
Cap Ceramic C0G/NP0; Manufacturer: Various; Part Number: 3.3nF 0805 50V 5% C0G/NP0; Tol: 5%; Package: CAPC0805X110N; EDM-PN: *; Text2: *; SAAB PN: *; DCE Part No: *
footprint CAPC0805X110N (Chip Capacitor, 0805, 2-Leads, Body 2.0x1.3mm, IPC Medium Density)
pins: 1, 2

## 3.3nF_0805N_50V_5%_X7R
designator C?, comment value 3.3nF  Voltage: 50V  Text1: 0805  (hidden comment: 3.3nF_C0805_50V_5%_X7R)
Cap Ceramic X7R; Manufacturer: Various; Part Number: 3.3nF 0805 50V 5% X7R; Tol: 5%; Package: CAPC0805X110N; EDM-PN: *; Text2: *; SAAB PN: *; DCE Part No: *
footprint CAPC0805X110N (Chip Capacitor, 0805, 2-Leads, Body 2.0x1.3mm, IPC Medium Density)
pins: 1, 2

## 3.3nF_0805N_50V_10%_X7R
designator C?, comment value 3.3nF  Voltage: 50V  Text1: 0805  (hidden comment: 3.3nF_C0805_50V_10%_X7R)
Cap Ceramic X7R; Manufacturer: Various; Part Number: 3.3nF 0805 50V 10% X7R; Tol: 10%; Package: CAPC0805X110N; EDM-PN: *; Text2: *; SAAB PN: *; DCE Part No: *
footprint CAPC0805X110N (Chip Capacitor, 0805, 2-Leads, Body 2.0x1.3mm, IPC Medium Density)
pins: 1, 2

## 3.3nF_0805N_100V_10%_X7R
designator C?, comment value 3.3nF  Voltage: 100V  Text1: 0805  (hidden comment: 3.3nF_C0805_100V_10%_X7R)
Cap Ceramic X7R; Manufacturer: Various; Part Number: 3.3nF 0805 100V 10% X7R; Tol: 10%; Package: CAPC0805X110N; EDM-PN: *; Text2: *; SAAB PN: *; DCE Part No: *
footprint CAPC0805X110N (Chip Capacitor, 0805, 2-Leads, Body 2.0x1.3mm, IPC Medium Density)
pins: 1, 2

## 3.3nF_1812N_2kV_10%_X7R
designator C?, comment value 3.3nF  Voltage: 2kV  Text1: 1812  (hidden comment: 3.3nF_C1812_2kV_10%_X7R)
Cap Ceramic X7R; Manufacturer: Various; Part Number: 3.3nF 1812 2kV 10% X7R; Tol: 10%; Package: CAPC1812X135N; EDM-PN: *; Text2: *; SAAB PN: *; DCE Part No: *
footprint CAPC1812X135N (Chip Capacitor, 1812, 2-Leads, Body 4.5x3.2mm, IPC Medium Density)
pins: 1, 2

## 3.3nF_C0805_100V_20%_X7R-Feed Through
designator C?, comment value 3.3nF  Voltage: 100V  Text1: 0805  (hidden comment: 0805J1000332MXTE07)
Cap Ceramic Feed Through X7R; Manufacturer: Knowles; EDM-PN: CAP1370; Tol: 20%; Part Number: 0805J1000332MXTE07; Package: CAPC0805-3TERM; Text2: *; SAAB PN: *; DCE Part No: *
footprint CAPC0805-3TERM (Cap 0805 3 Terminal 2.0x1.27mm)
pins: 1, 2, 3

## 3.3pF_0402N_50V_0.25pF_C0G/NP0
designator C?, comment value 3.3pF  Voltage: 50V  Text1: 0402  (hidden comment: 1.5pF_C0402_50V_0.25pF_C0G/NP0)
Cap Ceramic C0G/NP0; Manufacturer: Various; Part Number: 3.3pF 0402 50V 0.25pF C0G/NP0; EDM-PN: CAP797; Tol: 0.25pF; Package: CAPC0402X60N; Text2: *; SAAB PN: *; DCE Part No: *
footprint CAPC0402X60N (Chip Capacitor, 0402, 2-Leads, Body 1.0x0.5mm, IPC Medium Density)
pins: 1, 2

## 3.3pF_0402N_50V_0.25pF_C0G/NP0-CBR04C339C5GAC
designator C?, comment value 3.3pF  Voltage: 50V  Text1: 0402  (hidden comment: CBR04C339C5GAC)
Cap Ceramic C0G/NP0 HiQ-CBR Series for RF; Manufacturer: Kemet; EDM-PN: CAP1400; Tol: 0.25pF; Part Number: CBR04C339C5GAC; Package: CAPC0402X60N; Text2: *; SAAB PN: *; DCE Part No: *
footprint CAPC0402X60N (Chip Capacitor, 0402, 2-Leads, Body 1.0x0.5mm, IPC Medium Density)
pins: 1, 2

## 3.3pF_0402N_50V_10%_C0G/NP0
designator C?, comment value 3.3pF  Voltage: 50V  Text1: 0402  (hidden comment: 1.5pF_C0402_50V_10%_C0G/NP0)
Cap Ceramic C0G/NP0; Manufacturer: Various; Part Number: 3.3pF 0402 50V 10% C0G/NP0; Tol: 10%; Package: CAPC0402X60N; EDM-PN: *; Text2: *; SAAB PN: *; DCE Part No: *
footprint CAPC0402X60N (Chip Capacitor, 0402, 2-Leads, Body 1.0x0.5mm, IPC Medium Density)
pins: 1, 2

## 3.3pF_0603N_50V_5%_C0G/NP0
designator C?, comment value 3.3pF  Voltage: 50V  Text1: 0603  (hidden comment: 3.3pF_C0603_50V_5%_C0G/NP0)
Cap Ceramic C0G/NP0; Manufacturer: Various; Part Number: 3.3pF 0603 50V 5% C0G/NP0; Tol: 5%; Package: CAPC0603X85N; EDM-PN: *; Text2: *; SAAB PN: *; DCE Part No: *
footprint CAPC0603X85N (Chip Capacitor, 0603, 2-Leads, Body 1.6x0.8mm, IPC Medium Density)
pins: 1, 2

## 3.3pF_0805N_50V_5%_C0G/NP0
designator C?, comment value 3.3pF  Voltage: 50V  Text1: 0805  (hidden comment: 3.3pF_C0805_50V_5%_C0G/NP0)
Cap Ceramic C0G/NP0; Manufacturer: Various; Part Number: 3.3pF 0805 50V 5% C0G/NP0; Tol: 5%; Package: CAPC0805X110N; EDM-PN: *; Text2: *; SAAB PN: *; DCE Part No: *
footprint CAPC0805X110N (Chip Capacitor, 0805, 2-Leads, Body 2.0x1.3mm, IPC Medium Density)
pins: 1, 2

## 3.3uF_0603N_16V_10%_X5R
designator C?, comment value 3.3uF  Voltage: 16V  Text1: 0603  (hidden comment: 3.3uF_C0603_16V_10%_X5R)
Cap Ceramic X5R; Manufacturer: Various; Part Number: 3.3uF 0603 16V 10% X5R; EDM-PN: CAP647; Tol: 10%; Package: CAPC0603X85N; Text2: *; SAAB PN: *; DCE Part No: *
footprint CAPC0603X85N (Chip Capacitor, 0603, 2-Leads, Body 1.6x0.8mm, IPC Medium Density)
pins: 1, 2

## 3.3uF_0805N_16V_10%_X7R
designator C?, comment value 3.3uF  Voltage: 16V  Text1: 0805  (hidden comment: 3.3uF_C0805_16V_10%_X7R)
Cap Ceramic X7R; Manufacturer: Various; Part Number: 3.3uF 0805 16V 10% X7R; EDM-PN: CAP640; Tol: 10%; Package: CAPC0805X110N; Text2: *; SAAB PN: *; DCE Part No: *
footprint CAPC0805X110N (Chip Capacitor, 0805, 2-Leads, Body 2.0x1.3mm, IPC Medium Density)
pins: 1, 2
